# Altium footprint library my_AP_lib_pcb.PcbLib: 115 footprints (part 5 of 8)
Each footprint in its own frame and in the unit in brackets; x right, y up, seen from the top. Pads: shape width x height; smd on the part's side, far side on the other; paste and mask are expansions set on the pad; w line width, h text height; cw(c..) or ccw(c..) is an arc to the next point about the centre after c.
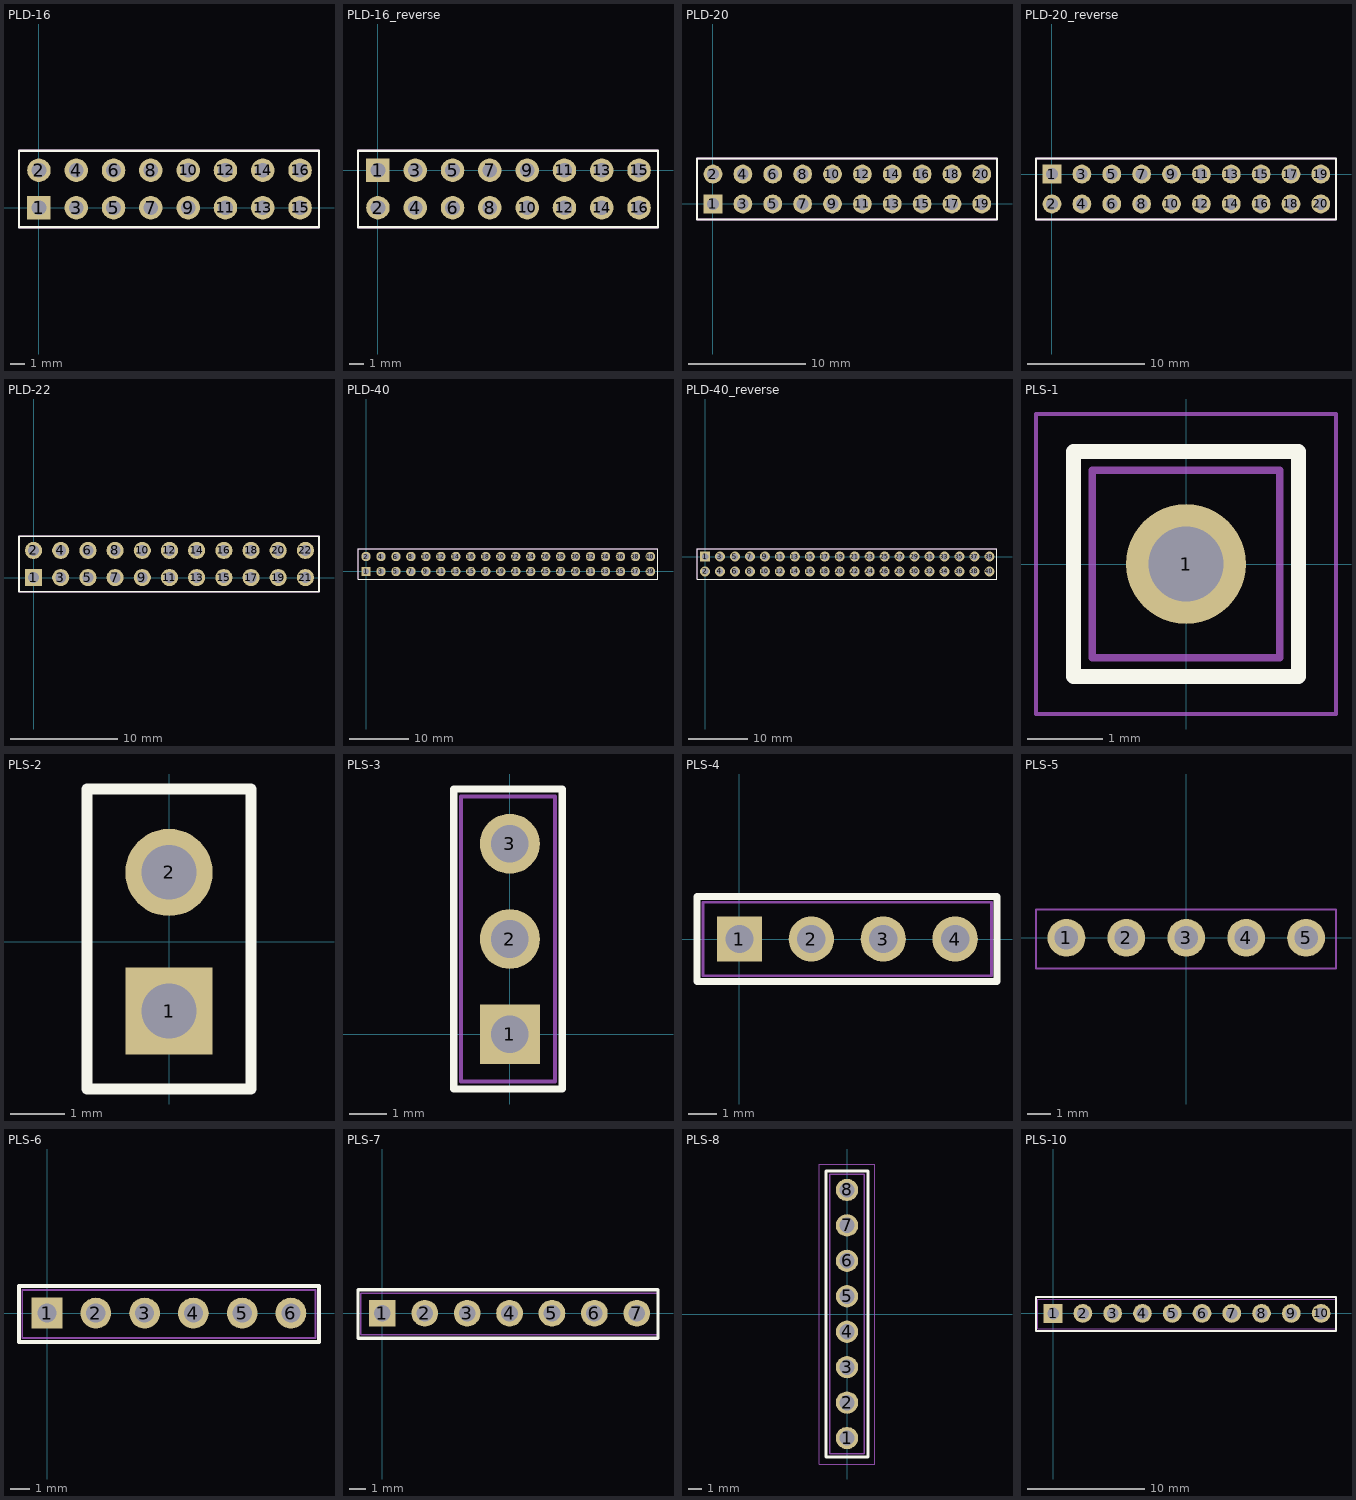
[diagram p4: the footprints below, top view; thin cyan lines are the x and y axes]

## PLD-16 [mm]
pads (16):
  rect 1.6x1.6 hole 1: 1(0,0)
  round 1.6 hole 1: 2(0,2.54) 3(2.54,0) 4(2.54,2.54) 5(5.08,0) 6(5.08,2.54) 7(7.62,0) 8(7.62,2.54) 9(10.16,0) 10(10.16,2.54) 11(12.7,0) 12(12.7,2.54) 13(15.24,0) 14(15.24,2.54) 15(17.78,0) 16(17.78,2.54)
Top Overlay:
  lines w0.15: -1.36,-1.33 19.07,-1.33 19.07,3.87 -1.36,3.87 -1.36,-1.33
Mechanical 15:
  lines w0.15: -1.36,-1.33 19.07,-1.33 19.07,3.87 -1.36,3.87 -1.36,-1.33
3D body "User Library-PLS-2.step": height 8.54, standoff -3, extent -1.29,-1.255 1.25,3.825
3D body "User Library-PLS-2.step": height 8.54, standoff -3, extent 1.25,-1.255 3.79,3.825
3D body "User Library-PLS-2.step": height 8.54, standoff -3, extent 3.79,-1.255 6.33,3.825
3D body "User Library-PLS-2.step": height 8.54, standoff -3, extent 6.33,-1.255 8.87,3.825
3D body "User Library-PLS-2.step": height 8.54, standoff -3, extent 11.41,-1.255 13.95,3.825
3D body "User Library-PLS-2.step": height 8.54, standoff -3, extent 8.87,-1.255 11.41,3.825
3D body "User Library-PLS-2.step": height 8.54, standoff -3, extent 13.95,-1.255 16.49,3.825
3D body "User Library-PLS-2.step": height 8.54, standoff -3, extent 16.49,-1.255 19.03,3.825

## PLD-16_reverse [mm]
pads (16):
  rect 1.6x1.6 hole 1: 1(0,0)
  round 1.6 hole 1: 2(0,-2.54) 3(2.54,0) 4(2.54,-2.54) 5(5.08,0) 6(5.08,-2.54) 7(7.62,0) 8(7.62,-2.54) 9(10.16,0) 10(10.16,-2.54) 11(12.7,0) 12(12.7,-2.54) 13(15.24,0) 14(15.24,-2.54) 15(17.78,0) 16(17.78,-2.54)
Top Overlay:
  lines w0.15: -1.36,-3.87 19.07,-3.87 19.07,1.33 -1.36,1.33 -1.36,-3.87
Mechanical 15:
  lines w0.15: -1.36,-3.87 19.07,-3.87 19.07,1.33 -1.36,1.33 -1.36,-3.87
3D body "User Library-PLS-2.step": height 8.54, standoff -3, extent -1.29,-3.795 1.25,1.285
3D body "User Library-PLS-2.step": height 8.54, standoff -3, extent 1.25,-3.795 3.79,1.285
3D body "User Library-PLS-2.step": height 8.54, standoff -3, extent 3.79,-3.795 6.33,1.285
3D body "User Library-PLS-2.step": height 8.54, standoff -3, extent 6.33,-3.795 8.87,1.285
3D body "User Library-PLS-2.step": height 8.54, standoff -3, extent 11.41,-3.795 13.95,1.285
3D body "User Library-PLS-2.step": height 8.54, standoff -3, extent 8.87,-3.795 11.41,1.285
3D body "User Library-PLS-2.step": height 8.54, standoff -3, extent 13.95,-3.795 16.49,1.285
3D body "User Library-PLS-2.step": height 8.54, standoff -3, extent 16.49,-3.795 19.03,1.285

## PLD-20 [mm]
pads (20):
  rect 1.6x1.6 hole 1: 1(0,0)
  round 1.6 hole 1: 2(0,2.54) 3(2.54,0) 4(2.54,2.54) 5(5.08,0) 6(5.08,2.54) 7(7.62,0) 8(7.62,2.54) 9(10.16,0) 10(10.16,2.54) 11(12.7,0) 12(12.7,2.54) 13(15.24,0) 14(15.24,2.54) 15(17.78,0) 16(17.78,2.54) 17(20.32,0) 18(20.32,2.54) 19(22.86,0) 20(22.86,2.54)
Top Overlay:
  lines w0.15: -1.36,-1.33 -1.36,3.87 24.15,3.87 24.15,-1.33 -1.36,-1.33
Mechanical 15:
  lines w0.15: -1.36,-1.33 -1.36,3.87 24.15,3.87 24.15,-1.33 -1.36,-1.33
3D body "User Library-PLS-2.step": height 8.54, standoff -3, extent 8.87,-1.255 11.41,3.825
3D body "User Library-PLS-2.step": height 8.54, standoff -3, extent 11.41,-1.255 13.95,3.825
3D body "User Library-PLS-2.step": height 8.54, standoff -3, extent 6.33,-1.255 8.87,3.825
3D body "User Library-PLS-2.step": height 8.54, standoff -3, extent 3.79,-1.255 6.33,3.825
3D body "User Library-PLS-2.step": height 8.54, standoff -3, extent 1.25,-1.255 3.79,3.825
3D body "User Library-PLS-2.step": height 8.54, standoff -3, extent -1.29,-1.255 1.25,3.825
3D body "User Library-PLS-2.step": height 8.54, standoff -3, extent 19.03,-1.255 21.57,3.825
3D body "User Library-PLS-2.step": height 8.54, standoff -3, extent 21.57,-1.255 24.11,3.825
3D body "User Library-PLS-2.step": height 8.54, standoff -3, extent 16.49,-1.255 19.03,3.825
3D body "User Library-PLS-2.step": height 8.54, standoff -3, extent 13.95,-1.255 16.49,3.825

## PLD-20_reverse [mm]
pads (20):
  rect 1.6x1.6 hole 1: 1(0,0)
  round 1.6 hole 1: 2(0,-2.54) 3(2.54,0) 4(2.54,-2.54) 5(5.08,0) 6(5.08,-2.54) 7(7.62,0) 8(7.62,-2.54) 9(10.16,0) 10(10.16,-2.54) 11(12.7,0) 12(12.7,-2.54) 13(15.24,0) 14(15.24,-2.54) 15(17.78,0) 16(17.78,-2.54) 17(20.32,0) 18(20.32,-2.54) 19(22.86,0) 20(22.86,-2.54)
Top Overlay:
  lines w0.15: -1.36,-3.87 -1.36,1.33 24.15,1.33 24.15,-3.87 -1.36,-3.87
Mechanical 15:
  lines w0.15: -1.36,-3.87 -1.36,1.33 24.15,1.33 24.15,-3.87 -1.36,-3.87
3D body "User Library-PLS-2.step": height 8.54, standoff -3, extent 8.87,-3.795 11.41,1.285
3D body "User Library-PLS-2.step": height 8.54, standoff -3, extent 11.41,-3.795 13.95,1.285
3D body "User Library-PLS-2.step": height 8.54, standoff -3, extent 6.33,-3.795 8.87,1.285
3D body "User Library-PLS-2.step": height 8.54, standoff -3, extent 3.79,-3.795 6.33,1.285
3D body "User Library-PLS-2.step": height 8.54, standoff -3, extent 1.25,-3.795 3.79,1.285
3D body "User Library-PLS-2.step": height 8.54, standoff -3, extent -1.29,-3.795 1.25,1.285
3D body "User Library-PLS-2.step": height 8.54, standoff -3, extent 19.03,-3.795 21.57,1.285
3D body "User Library-PLS-2.step": height 8.54, standoff -3, extent 21.57,-3.795 24.11,1.285
3D body "User Library-PLS-2.step": height 8.54, standoff -3, extent 16.49,-3.795 19.03,1.285
3D body "User Library-PLS-2.step": height 8.54, standoff -3, extent 13.95,-3.795 16.49,1.285

## PLD-22 [mm]
pads (22):
  rect 1.6x1.6 hole 1: 1(0,0)
  round 1.6 hole 1: 2(0,2.54) 3(2.54,0) 4(2.54,2.54) 5(5.08,0) 6(5.08,2.54) 7(7.62,0) 8(7.62,2.54) 9(10.16,0) 10(10.16,2.54) 11(12.7,0) 12(12.7,2.54) 13(15.24,0) 14(15.24,2.54) 15(17.78,0) 16(17.78,2.54) 17(20.32,0) 18(20.32,2.54) 19(22.86,0) 20(22.86,2.54) 21(25.4,0) 22(25.4,2.54)
Top Overlay:
  lines w0.15: -1.36,-1.33 -1.36,3.87 26.67,3.87 26.67,-1.33 -1.36,-1.33
Mechanical 15:
  lines w0.15: -1.36,-1.33 26.67,-1.33 26.67,3.87 -1.36,3.87 -1.36,-1.33
3D body "User Library-PLS-2.step": height 8.54, standoff -3, extent 24.11,-1.255 26.65,3.825
3D body "User Library-PLS-2.step": height 8.54, standoff -3, extent 8.87,-1.255 11.41,3.825
3D body "User Library-PLS-2.step": height 8.54, standoff -3, extent 11.41,-1.255 13.95,3.825
3D body "User Library-PLS-2.step": height 8.54, standoff -3, extent 6.33,-1.255 8.87,3.825
3D body "User Library-PLS-2.step": height 8.54, standoff -3, extent 3.79,-1.255 6.33,3.825
3D body "User Library-PLS-2.step": height 8.54, standoff -3, extent 1.25,-1.255 3.79,3.825
3D body "User Library-PLS-2.step": height 8.54, standoff -3, extent -1.29,-1.255 1.25,3.825
3D body "User Library-PLS-2.step": height 8.54, standoff -3, extent 19.03,-1.255 21.57,3.825
3D body "User Library-PLS-2.step": height 8.54, standoff -3, extent 21.57,-1.255 24.11,3.825
3D body "User Library-PLS-2.step": height 8.54, standoff -3, extent 16.49,-1.255 19.03,3.825
3D body "User Library-PLS-2.step": height 8.54, standoff -3, extent 13.95,-1.255 16.49,3.825

## PLD-40 [mm]
pads (40):
  rect 1.6x1.6 hole 1: 1(0,0)
  round 1.6 hole 1: 2(0,2.54) 3(2.54,0) 4(2.54,2.54) 5(5.08,0) 6(5.08,2.54) 7(7.62,0) 8(7.62,2.54) 9(10.16,0) 10(10.16,2.54) 11(12.7,0) 12(12.7,2.54) 13(15.24,0) 14(15.24,2.54) 15(17.78,0) 16(17.78,2.54) 17(20.32,0) 18(20.32,2.54) 19(22.86,0) 20(22.86,2.54) 21(25.4,0) 22(25.4,2.54) 23(27.94,0) 24(27.94,2.54) 25(30.48,0) 26(30.48,2.54) 27(33.02,0) 28(33.02,2.54) 29(35.56,0) 30(35.56,2.54) 31(38.1,0) 32(38.1,2.54) 33(40.64,0) 34(40.64,2.54) 35(43.18,0) 36(43.18,2.54) 37(45.72,0) 38(45.72,2.54) 39(48.26,0) 40(48.26,2.54)
Top Overlay:
  lines w0.15: -1.36,-1.33 -1.36,3.87 49.55,3.87 49.55,-1.33 -1.36,-1.33
Mechanical 15:
  lines w0.15: -1.36,-1.33 -1.36,3.87 49.55,3.87 49.55,-1.33 -1.36,-1.33
3D body "User Library-PLS-2.step": height 8.54, standoff -3, extent -1.29,-1.255 1.25,3.825
3D body "User Library-PLS-2.step": height 8.54, standoff -3, extent 1.25,-1.255 3.79,3.825
3D body "User Library-PLS-2.step": height 8.54, standoff -3, extent 3.79,-1.255 6.33,3.825
3D body "User Library-PLS-2.step": height 8.54, standoff -3, extent 6.33,-1.255 8.87,3.825
3D body "User Library-PLS-2.step": height 8.54, standoff -3, extent 8.87,-1.255 11.41,3.825
3D body "User Library-PLS-2.step": height 8.54, standoff -3, extent 11.41,-1.255 13.95,3.825
3D body "User Library-PLS-2.step": height 8.54, standoff -3, extent 13.95,-1.255 16.49,3.825
3D body "User Library-PLS-2.step": height 8.54, standoff -3, extent 16.49,-1.255 19.03,3.825
3D body "User Library-PLS-2.step": height 8.54, standoff -3, extent 19.03,-1.255 21.57,3.825
3D body "User Library-PLS-2.step": height 8.54, standoff -3, extent 21.57,-1.255 24.11,3.825
3D body "User Library-PLS-2.step": height 8.54, standoff -3, extent 24.11,-1.255 26.65,3.825
3D body "User Library-PLS-2.step": height 8.54, standoff -3, extent 26.65,-1.255 29.19,3.825
3D body "User Library-PLS-2.step": height 8.54, standoff -3, extent 29.19,-1.255 31.73,3.825
3D body "User Library-PLS-2.step": height 8.54, standoff -3, extent 31.73,-1.255 34.27,3.825
3D body "User Library-PLS-2.step": height 8.54, standoff -3, extent 34.27,-1.255 36.81,3.825
3D body "User Library-PLS-2.step": height 8.54, standoff -3, extent 36.81,-1.255 39.35,3.825
3D body "User Library-PLS-2.step": height 8.54, standoff -3, extent 39.35,-1.255 41.89,3.825
3D body "User Library-PLS-2.step": height 8.54, standoff -3, extent 41.89,-1.255 44.43,3.825
3D body "User Library-PLS-2.step": height 8.54, standoff -3, extent 44.43,-1.255 46.97,3.825
3D body "User Library-PLS-2.step": height 8.54, standoff -3, extent 46.97,-1.255 49.51,3.825

## PLD-40_reverse [mm]
pads (40):
  rect 1.7x1.7 hole 1.1: 1(0,0)
  round 1.7 hole 1.1: 2(0,-2.54) 3(2.54,0) 4(2.54,-2.54) 5(5.08,0) 6(5.08,-2.54) 7(7.62,0) 8(7.62,-2.54) 9(10.16,0) 10(10.16,-2.54) 11(12.7,0) 12(12.7,-2.54) 13(15.24,0) 14(15.24,-2.54) 15(17.78,0) 16(17.78,-2.54) 17(20.32,0) 18(20.32,-2.54) 19(22.86,0) 20(22.86,-2.54) 21(25.4,0) 22(25.4,-2.54) 23(27.94,0) 24(27.94,-2.54) 25(30.48,0) 26(30.48,-2.54) 27(33.02,0) 28(33.02,-2.54) 29(35.56,0) 30(35.56,-2.54) 31(38.1,0) 32(38.1,-2.54) 33(40.64,0) 34(40.64,-2.54) 35(43.18,0) 36(43.18,-2.54) 37(45.72,0) 38(45.72,-2.54) 39(48.26,0) 40(48.26,-2.54)
Top Overlay:
  lines w0.15: -1.36,-3.87 49.55,-3.87 49.55,1.33 -1.36,1.33 -1.36,-3.87
Mechanical 15:
  lines w0.15: -1.36,-3.87 49.55,-3.87 49.55,1.33 -1.36,1.33 -1.36,-3.87
3D body "User Library-PLS-2.step": height 8.54, standoff -3, extent 46.97,-3.795 49.51,1.285
3D body "User Library-PLS-2.step": height 8.54, standoff -3, extent 44.43,-3.795 46.97,1.285
3D body "User Library-PLS-2.step": height 8.54, standoff -3, extent 41.89,-3.795 44.43,1.285
3D body "User Library-PLS-2.step": height 8.54, standoff -3, extent 39.35,-3.795 41.89,1.285
3D body "User Library-PLS-2.step": height 8.54, standoff -3, extent 36.81,-3.795 39.35,1.285
3D body "User Library-PLS-2.step": height 8.54, standoff -3, extent 34.27,-3.795 36.81,1.285
3D body "User Library-PLS-2.step": height 8.54, standoff -3, extent 31.73,-3.795 34.27,1.285
3D body "User Library-PLS-2.step": height 8.54, standoff -3, extent 29.19,-3.795 31.73,1.285
3D body "User Library-PLS-2.step": height 8.54, standoff -3, extent 26.65,-3.795 29.19,1.285
3D body "User Library-PLS-2.step": height 8.54, standoff -3, extent 24.11,-3.795 26.65,1.285
3D body "User Library-PLS-2.step": height 8.54, standoff -3, extent 21.57,-3.795 24.11,1.285
3D body "User Library-PLS-2.step": height 8.54, standoff -3, extent 19.03,-3.795 21.57,1.285
3D body "User Library-PLS-2.step": height 8.54, standoff -3, extent 16.49,-3.795 19.03,1.285
3D body "User Library-PLS-2.step": height 8.54, standoff -3, extent 13.95,-3.795 16.49,1.285
3D body "User Library-PLS-2.step": height 8.54, standoff -3, extent 11.41,-3.795 13.95,1.285
3D body "User Library-PLS-2.step": height 8.54, standoff -3, extent 8.87,-3.795 11.41,1.285
3D body "User Library-PLS-2.step": height 8.54, standoff -3, extent 6.33,-3.795 8.87,1.285
3D body "User Library-PLS-2.step": height 8.54, standoff -3, extent 3.79,-3.795 6.33,1.285
3D body "User Library-PLS-2.step": height 8.54, standoff -3, extent 1.25,-3.795 3.79,1.285
3D body "User Library-PLS-2.step": height 8.54, standoff -3, extent -1.29,-3.795 1.25,1.285

## PLS-1 [mm]
height 1
pads (1):
  round 1.6 hole 1 mask+0.05: 1(0,0)
Top Overlay:
  lines w0.2: -1.5,-1.5 1.5,-1.5 1.5,1.5 -1.5,1.5 -1.5,-1.5
Mechanical 5:
  lines w0.1: -1.25,-1.25 -1.25,1.25 1.25,1.25 1.25,-1.25 -1.25,-1.25
  text ".Designator" at 0.5,-0.73 h2
Mechanical 9:
  lines w0.05: -2,-2 -2,2 2,2 2,-2 -2,-2
3D body "User Library-PLS-1.step": height 8.44, standoff -3, extent -1.27,-1.27 1.27,1.27

## PLS-2 [mm]
height 1
pads (2):
  rect 1.6x1.6 hole 1: 1(0,-1.27)
  round 1.6 hole 1: 2(0,1.27)
Top Overlay:
  lines w0.2: -1.5,-2.7 -1.5,2.8 1.5,2.8 1.5,-2.7 -1.5,-2.7
3D body "User Library-PLS-2.step": height 8.54, standoff -3, extent -1.29,-2.525 1.25,2.555

## PLS-3 [mm]
height 1
pads (3):
  rect 1.6x1.6 hole 1: 1(0,0)
  round 1.6 hole 1: 2(0,2.54) 3(0,5.08)
Top Overlay:
  lines w0.2: -1.5,-1.46 -1.5,6.54 1.4,6.54 1.4,-1.46 -1.5,-1.46
Mechanical 1:
  lines w0.1: -1.3,-1.26 1.2,-1.26 1.2,6.34 -1.3,6.34 -1.3,-1.26
3D body "User Library-PLS-3.step": height 8.54, standoff -3, extent -1.29,-1.255 1.25,6.365

## PLS-4 [mm]
pads (4):
  rect 1.6x1.6 hole 1: 1(0,0)
  round 1.6 hole 1: 2(2.54,0) 3(5.08,0) 4(7.62,0)
Top Overlay:
  lines w0.254: -1.5,-1.5 9.1,-1.5 9.1,1.5 -1.5,1.5 -1.5,-1.5
Mechanical 15:
  lines w0.1: -1.29,-1.3 -1.29,1.3 8.91,1.3 8.91,-1.3 -1.29,-1.3
  text ".Designator" at 2.11,-0.1 h0.5
3D body "PLS-4.STEP": height 9.2, standoff -3.5, extent -1.27,-1.27 8.89,1.27

## PLS-5 [mm]
pads (5):
  round 1.6 hole 1: 1(-5.08,0) 2(-2.54,0) 3(0,0) 4(2.54,0) 5(5.08,0)
Mechanical 15:
  lines w0.1: -6.37,-1.3 -6.37,1.2 6.35,1.2 6.35,-1.3 -6.37,-1.3
  text ".Designator" at -0.889,-0.127 h0.5
3D body "User Library-PLS-5.step": height 8.54, standoff -3, extent -6.35,-1.27 6.35,1.27

## PLS-6 [mm]
pads (6):
  rect 1.6x1.6 hole 1: 1(0,0)
  round 1.6 hole 1: 2(2.54,0) 3(5.08,0) 4(7.62,0) 5(10.16,0) 6(12.7,0)
Top Overlay:
  lines w0.2: -1.46,-1.5 14.16,-1.5 14.16,1.4 -1.46,1.4 -1.46,-1.5
Mechanical 15:
  lines w0.1: -1.29,-1.3 -1.29,1.2 13.97,1.2 13.97,-1.3 -1.29,-1.3
3D body "User Library-PLS-6-1.step": height 8.54, standoff -3, extent -1.27,-1.27 13.97,1.27

## PLS-7 [mm]
pads (7):
  rect 1.6x1.6 hole 1: 1(0,0)
  round 1.6 hole 1: 2(2.54,0) 3(5.08,0) 4(7.62,0) 5(10.16,0) 6(12.7,0) 7(15.24,0)
Top Overlay:
  lines w0.2: -1.46,-1.5 -1.46,1.4 16.51,1.4 16.51,-1.5 -1.46,-1.5
Mechanical 15:
  lines w0.1: -1.29,-1.3 16.51,-1.3 16.51,1.2 -1.29,1.2 -1.29,-1.3
3D body "User Library-PLS-6-1.step": height 8.54, standoff -3, extent -1.27,-1.27 13.97,1.27
3D body "User Library-PLS-6-1.step": height 8.54, standoff -3, extent 1.27,-1.27 16.51,1.27

## PLS-8 [mm]
height 1
pads (8):
  round 1.6 hole 1.1 mask+0.05: 1(0,-8.89) 2(0,-6.35) 3(0,-3.81) 4(0,-1.27) 5(0,1.27) 6(0,3.81) 7(0,6.35) 8(0,8.89)
Top Overlay:
  lines w0.2: -1.5,-10.25 1.5,-10.25 1.5,10.25 -1.5,10.25 -1.5,-10.25
Mechanical 5:
  lines w0.1: -1.25,-10 1.25,-10 1.25,10 -1.25,10 -1.25,-10
  text ".Designator" at 0.5,-4.34 h2
Mechanical 9:
  lines w0.05: -2,-10.75 2,-10.75 2,10.75 -2,10.75 -2,-10.75
3D body "PLS-8.STEP": height 8.54, standoff -3, extent -1.3,-10.16 1.24,10.16

## PLS-10 [mm]
pads (10):
  rect 1.6x1.6 hole 1: 1(0,0)
  round 1.6 hole 1: 2(2.54,0) 3(5.08,0) 4(7.62,0) 5(10.16,0) 6(12.7,0) 7(15.24,0) 8(17.78,0) 9(20.32,0) 10(22.86,0)
Top Overlay:
  lines w0.2: -1.46,-1.5 -1.46,1.4 24.13,1.4 24.13,-1.5 -1.46,-1.5
Mechanical 15:
  lines w0.1: -1.29,-1.3 24.13,-1.3 24.13,1.2 -1.29,1.2 -1.29,-1.3
3D body "User Library-PLS-6-1.step": height 8.54, standoff -3, extent -1.27,-1.27 13.97,1.27
3D body "User Library-PLS-6-1.step": height 8.54, standoff -3, extent 8.89,-1.27 24.13,1.27